# Altium footprint library PIF_robot.PcbLib: 15 footprints
Each footprint in its own frame and in the unit in brackets; x right, y up, seen from the top. Pads: shape width x height; smd on the part's side, far side on the other; paste and mask are expansions set on the pad; w line width, h text height; cw(c..) or ccw(c..) is an arc to the next point about the centre after c.
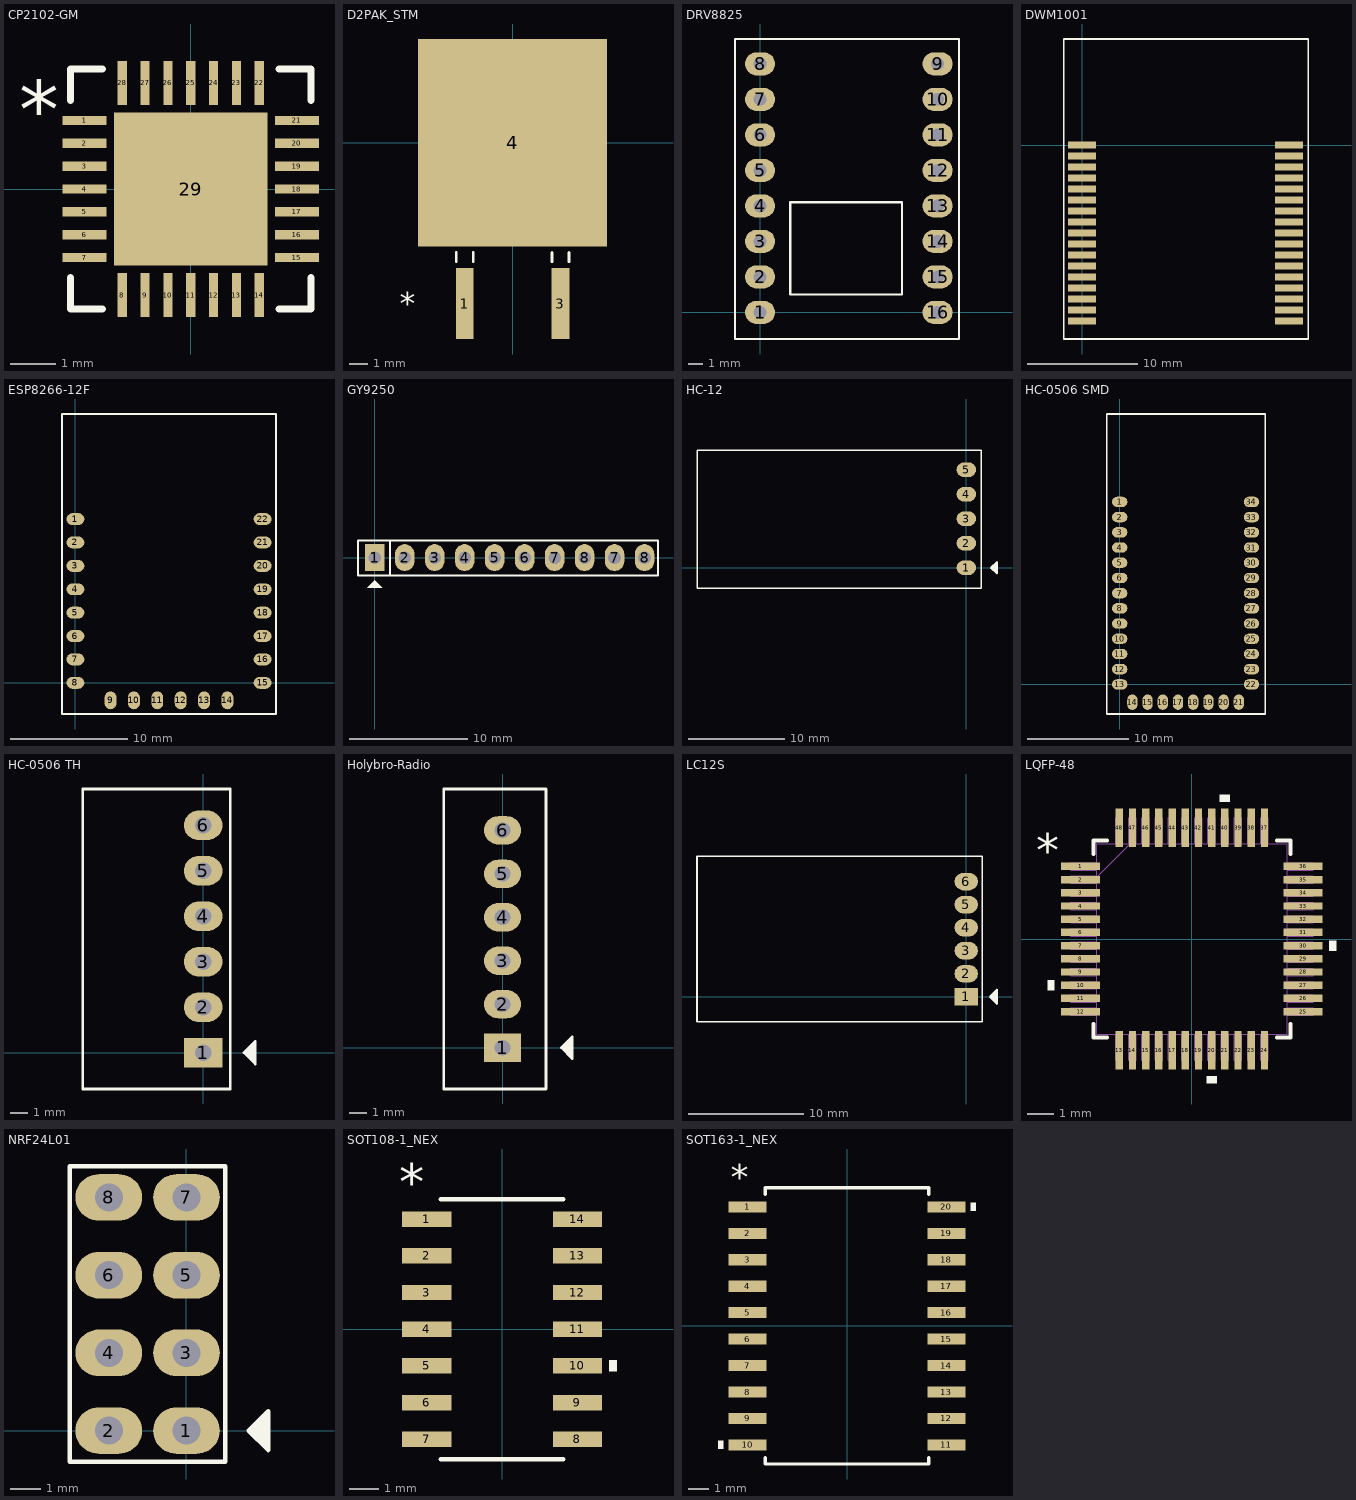
[diagram p0: the footprints below, top view; thin cyan lines are the x and y axes]

## CP2102-GM [mil]
pads (29):
  rect 38x8 smd paste+0 mask+0: 1(-91.5,59.06) 2(-91.5,39.37) 3(-91.5,19.68) 4(-91.5,0) 5(-91.5,-19.68) 6(-91.5,-39.37) 7(-91.5,-59.06) 15(91.5,-59.06) 16(91.5,-39.37) 17(91.5,-19.68) 18(91.5,0) 19(91.5,19.68) 20(91.5,39.37) 21(91.5,59.06)
  rect 8x38 smd paste+0 mask+0: 8(-59.06,-91.5) 9(-39.37,-91.5) 10(-19.68,-91.5) 11(0,-91.5) 12(19.68,-91.5) 13(39.37,-91.5) 14(59.06,-91.5) 22(59.06,91.5) 23(39.37,91.5) 24(19.68,91.5) 25(0,91.5) 26(-19.68,91.5) 27(-39.37,91.5) 28(-59.06,91.5)
  rect 132x132 smd paste-65.5 mask+0: 29(0,0)
Top Overlay:
  lines w6: -103.5,-76.16 -103.5,-103.5 -76.16,-103.5 ; -103.5,76.16 -103.5,103.5 -76.16,103.5 ; 76.16,-103.5 103.5,-103.5 103.5,-76.16 ; 76.16,103.5 103.5,103.5 103.5,76.16
  text "*" at -148,43.9 h50
Top Paste:
  region: 62.06,-3.94 3.94,-3.94 3.94,-62.06 62.06,-62.06
  region: 62.06,62.06 3.94,62.06 3.94,3.94 62.06,3.94
  region: -3.94,-3.94 -62.06,-3.94 -62.06,-62.06 -3.94,-62.06
  region: -3.94,62.06 -62.06,62.06 -62.06,3.94 -3.94,3.94
3D body "QFN28_5X5_SIL.step": height 37.09, standoff 0, extent -98.5,-98.5 98.51,98.51
3D body: height 10, standoff 0, extent 0,0 10,10

## D2PAK_STM [mil]
pads (3):
  rect 39x154 smd paste+0 mask+0: 1(-103.94,-349.5) 3(103.94,-349.5)
  rect 411x451 smd paste+0 mask+0: 4(0,0)
Top Overlay:
  lines w6: -122.44,-258.5 -122.44,-238.6 ; -85.44,-258.5 -85.44,-238.6 ; 85.44,-258.5 85.44,-238.6 ; 122.44,-258.5 122.44,-238.6
  text "*" at -245.37,-374.5 h50
3D body "D2PAK_STM.step": height 181.1, standoff -2.01, extent -204.48,-378.01 204.5,152.61
3D body: height 10, standoff 0, extent 0,0 10,10

## DRV8825 [mil]
pads (16):
  oval 85x65 hole 36: 1(0,0) 2(0,100) 3(0,200) 4(0,300) 5(0,400) 6(0,500) 7(0,600) 8(0,700) 9(500,700) 10(500,600) 11(500,500) 12(500,400) 13(500,300) 14(500,200) 15(500,100) 16(500,0)
Top Overlay:
  lines w6: -70,-75 560,-75 560,770 -70,770 -70,-75 ; 85,50 400,50 400,310 85,310 85,50
3D body "Driver DRV8825.stp": height 598.43, standoff 17.97, extent -45.28,-50.04 545.27,749.96

## DWM1001 [mm]
pads (34):
  rect 2.54x0.65 smd paste+0 mask+0: 1(0,0) 2(0,-1) 3(0,-2) 4(0,-3) 5(0,-4) 6(0,-5) 7(0,-6) 8(0,-7) 9(0,-8) 10(0,-9) 11(0,-10) 12(0,-11) 13(0,-12) 14(0,-13) 15(0,-14) 16(0,-15) 17(0,-16) 18(18.84,-16) 19(18.84,-15) 20(18.84,-14) 21(18.84,-13) 22(18.84,-12) 23(18.84,-11) 24(18.84,-10) 25(18.84,-9) 26(18.84,-8) 27(18.84,-7) 28(18.84,-6) 29(18.84,-5) 30(18.84,-4) 31(18.84,-3) 32(18.84,-2) 33(18.84,-1) 34(18.84,0)
Top Overlay:
  lines w0.152: -1.651,-17.653 20.574,-17.653 20.574,9.652 -1.651,9.652 -1.651,-17.653
3D body "dwm1001 v2.step": height 3.2, standoff 0, extent -0.167,-17.15 18.963,8.97

## ESP8266-12F [mil]
pads (22):
  oval 60x40 smd: 1(0,551.18) 2(0,472.44) 3(0,393.7) 4(0,314.96) 5(0,236.22) 6(0,157.48) 7(0,78.74) 8(0,0) 15(629.92,0) 16(629.92,78.74) 17(629.92,157.48) 18(629.92,236.22) 19(629.92,314.96) 20(629.92,393.7) 21(629.92,472.44) 22(629.92,551.18)
  oval 40x60 smd: 9(118.11,-59.06) 10(196.85,-59.06) 11(275.59,-59.06) 12(354.33,-59.06) 13(433.07,-59.06) 14(511.81,-59.06)
Top Overlay:
  lines w6: -45,-105 675,-105 675,905 -45,905 -45,-105
3D body "EPS8266 ESP-12F.STEP": height 104.33, standoff -1.38, extent -0.2,-59.29 630.12,885.79

## GY9250 [mil] "JP8"
height 200
pads (10):
  rect 65x90 hole 42: 1(0,0)
  oval 65x90 hole 42: 2(100,0) 3(200,0) 4(300,0) 5(400,0) 6(500,0) 7(600,0) 7(800,0) 8(700,0) 8(900,0)
Top Overlay:
  region: 0,-75 -25,-100 25,-100
  lines w7: 51,-60 51,56 ; -56,-60 -56,57 945,57 945,-60 -56,-60
3D body "MPU-9250.stp": height 266.97, standoff -235.99, extent -50,-60.55 950,530

## HC-12 [mil]
pads (5):
  oval 80x60 smd: 1(0,0) 2(0,100) 3(0,200) 4(0,300) 5(0,400)
Top Overlay:
  region: 30,-450
  region: 125,25 100,0 125,-25
  lines w6: -1100,-85 -1100,480 60,480 60,-85 -1100,-85 ; 100,0 125,-25 125,25 100,0
3D body "HC-12 SI4463 WIRELESS SERIAL MODULE.STEP": height 1019.68, standoff 0, extent -1081.12,-64.81 9.34,458.81

## HC-0506 SMD [mil]
pads (34):
  oval 60x40 smd: 1(0,708.66) 2(0,649.61) 3(0,590.55) 4(0,531.5) 5(0,472.44) 6(0,413.39) 7(0,354.33) 8(0,295.28) 9(0,236.22) 10(0,177.17) 11(0,118.11) 12(0,59.06) 13(0,0) 22(511.81,0) 23(511.81,59.06) 24(511.81,118.11) 25(511.81,177.17) 26(511.81,236.22) 27(511.81,295.28) 28(511.81,354.33) 29(511.81,413.39) 30(511.81,472.44) 31(511.81,531.5) 32(511.81,590.55) 33(511.81,649.61) 34(511.81,708.66)
  oval 40x60 smd: 14(49.21,-68.9) 15(108.27,-68.9) 16(167.32,-68.9) 17(226.38,-68.9) 18(285.43,-68.9) 19(344.49,-68.9) 20(403.54,-68.9) 21(462.6,-68.9)
Top Overlay:
  lines w6: -50,-115 -50,1050 565,1050 565,-115 555,-115 -50,-115
3D body "Bluetooth HC-06_.STEP": height 92.52, standoff 0, extent -20.08,-70 531.89,1032.76

## HC-0506 TH [mil]
pads (6):
  rect 85x65 hole 36: 1(0,0)
  oval 85x65 hole 36: 2(0,100) 3(0,200) 4(0,300) 5(0,400) 6(0,500)
Top Overlay:
  region: 115,25 90,0 115,-25
  lines w6: -265,-80 -183.75,-80 -21.25,-80 60,-80 60,580 -265,580 -265,-80 ; 90,0 115,25 115,-25 90,0
3D body "HC-05.STEP": height 1678.35, standoff 1.84, extent -247.37,-63.78 10.51,566.14

## Holybro-Radio [mil]
pads (6):
  rect 85x65 hole 36: 1(0,0)
  oval 85x65 hole 36: 2(0,100) 3(0,200) 4(0,300) 5(0,400) 6(0,500)
Top Overlay:
  region: 160,25 135,0 160,-25
  lines w6: -135,-95 -135,595 100,595 100,-95 -135,-95 ; 135,0 160,-25 160,25 135,0
3D body "JST - XH - Thru (V) - 6Pin - 2.54mm.stp": height 284, standoff -118, extent -131.5,-92.5 98.5,591.5

## LC12S [mil]
pads (6):
  rect 80x60 smd: 1(0,0)
  oval 80x60 smd: 2(0,78.74) 3(0,157.48) 4(0,236.22) 5(0,314.96) 6(0,393.7)
Top Overlay:
  region: 105,25 105,-25 80,0
  lines w5: 80,0 105,-25 105,25 85,5 80,0
  lines w6: -920,-85 -920,480 55,480 55,-85 -920,-85
3D body "LC12S.STEP": height 78.74, standoff 0, extent -908.31,-70.6 9.02,468.77
3D body: height 63.11, standoff 0, extent -270,205 -270,205

## LQFP-48 [mil]
pads (48):
  rect 58x11 smd: 1(-166,108.27) 2(-166,88.58) 3(-166,68.9) 4(-166,49.21) 5(-166,29.53) 6(-166,9.84) 7(-166,-9.84) 8(-166,-29.53) 9(-166,-49.21) 10(-166,-68.9) 11(-166,-88.58) 12(-166,-108.27) 25(166,-108.27) 26(166,-88.58) 27(166,-68.9) 28(166,-49.21) 29(166,-29.53) 30(166,-9.84) 31(166,9.84) 32(166,29.53) 33(166,49.21) 34(166,68.9) 35(166,88.58) 36(166,108.27)
  rect 11x58 smd: 13(-108.27,-166) 14(-88.58,-166) 15(-68.9,-166) 16(-49.21,-166) 17(-29.53,-166) 18(-9.84,-166) 19(9.84,-166) 20(29.53,-166) 21(49.21,-166) 22(68.9,-166) 23(88.58,-166) 24(108.27,-166) 37(108.27,166) 38(88.58,166) 39(68.9,166) 40(49.21,166) 41(29.53,166) 42(9.84,166) 43(-9.84,166) 44(-29.53,166) 45(-49.21,166) 46(-68.9,166) 47(-88.58,166) 48(-108.27,166)
Top Overlay:
  region: 56.71,205 41.71,205 41.71,215 56.71,215
  region: 205,-2.34 215,-2.34 215,-17.34 205,-17.34
  region: 37.03,-205 22.03,-205 22.03,-215 37.03,-215
  region: -205,-61.4 -215,-61.4 -215,-76.4 -205,-76.4
  lines w6: -147,-126.87 -147,-147 -126.87,-147 ; -147,126.87 -147,147 -126.87,147 ; 126.87,-147 147,-147 147,-126.87 ; 126.87,147 147,147 147,126.87
  text "*" at -232.5,108.11 h50
Mechanical 13:
  drawing of 197 lines, arcs and shapes, not listed
  text "*" at -139.5,93.11 h50
3D body: height 10, standoff 0, extent 0,0 10,10
3D body "LQFP-48.step": height 66.11, standoff 3, extent -180.98,-180.98 180.99,180.99
3D body: height 63.11, standoff 0, extent 0,0 0,0

## NRF24L01 [mil]
pads (8):
  oval 86x60 hole 36: 1(0,0) 2(-100,0) 3(0,100) 4(-100,100) 5(0,200) 6(-100,200) 7(0,300) 8(-100,300)
Top Overlay:
  region: 105,25 80,0 105,-25
  lines w6: -150,-40 -150,340 50,340 50,-40 -150,-40 ; 80,0 105,25 105,-25 80,0
3D body "NRF24l01_with_antenna.STEP": height 3860.96, standoff -24.41, extent -2827.3,-149.69 86.09,450.7

## SOT108-1_NEX [mil]
pads (14):
  rect 67x21 smd paste+0 mask+0: 1(-102.5,150) 2(-102.5,100) 3(-102.5,50) 4(-102.5,0) 5(-102.5,-50) 6(-102.5,-100) 7(-102.5,-150) 8(102.5,-150) 9(102.5,-100) 10(102.5,-50) 11(102.5,0) 12(102.5,50) 13(102.5,100) 14(102.5,150)
Top Overlay:
  region: 146,-42.5 156,-42.5 156,-57.5 146,-57.5
  lines w6: -83.5,-177 83.5,-177 ; -83.5,177 83.5,177
  text "*" at -140,175 h50
3D body: height 10, standoff 0, extent 0,0 10,10
3D body "SOT108-1_NEX.step": height 69.09, standoff 0, extent -122,-172 122.01,172.02

## SOT163-1_NEX [mil]
pads (20):
  rect 71x21 smd paste+0 mask+0: 1(-188,225) 2(-188,175) 3(-188,125) 4(-188,75) 5(-188,25) 6(-188,-25) 7(-188,-75) 8(-188,-125) 9(-188,-175) 10(-188,-225) 11(188,-225) 12(188,-175) 13(188,-125) 14(188,-75) 15(188,-25) 16(188,25) 17(188,75) 18(188,125) 19(188,175) 20(188,225)
Top Overlay:
  region: -233.5,-217.5 -243.5,-217.5 -243.5,-232.5 -233.5,-232.5
  region: 233.5,232.5 243.5,232.5 243.5,217.5 233.5,217.5
  lines w6: -154.5,-248.6 -154.5,-261 154.5,-261 154.5,-248.6 ; -154.5,248.6 -154.5,261 154.5,261 154.5,248.6
  text "*" at -220,255.99 h50
3D body: height 10, standoff 0, extent 0,0 10,10
3D body "SOT163-1_NEX.step": height 104.09, standoff 0, extent -209.48,-255.98 209.49,255.99